# Altium footprint library STM32_Watch.PcbLib: 180 footprints (part 12 of 12)
Each footprint in its own frame and in the unit in brackets; x right, y up, seen from the top. Pads: shape width x height; smd on the part's side, far side on the other; paste and mask are expansions set on the pad; w line width, h text height; cw(c..) or ccw(c..) is an arc to the next point about the centre after c.
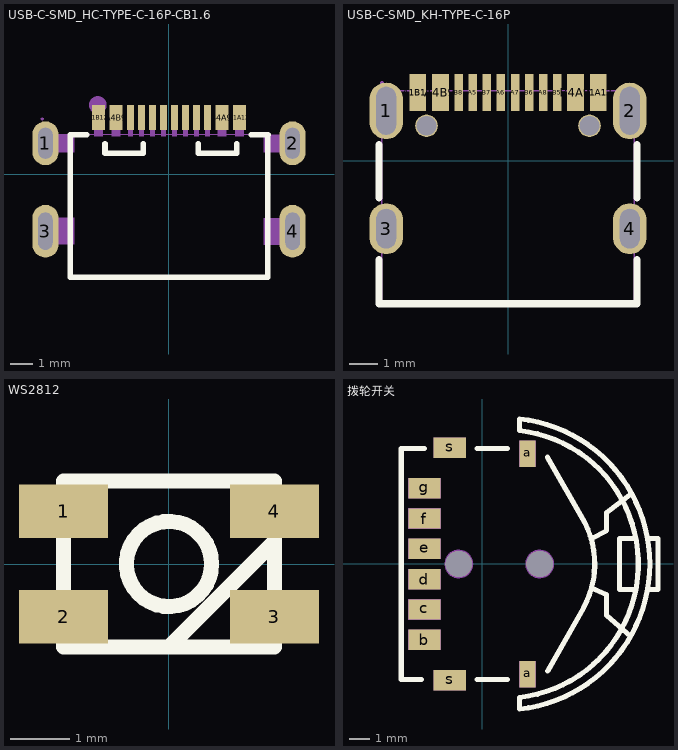
[diagram p11: the footprints below, top view; thin cyan lines are the x and y axes]

## USB-C-SMD_HC-TYPE-C-16P-CB1.6 [mm]
pads (16):
  oval 1.2x2 hole 0.65 slot 1.4 at 90 deg mask+0.051: 1(-5.62,1.414) 2(5.62,1.414)
  oval 1.2x2.4 hole 0.65 slot 1.7 at 90 deg copper offset 0.005,0 mask+0.051: 3(-5.625,-2.586)
  oval 1.2x2.4 hole 0.65 slot 1.7 at 90 deg copper offset -0.005,0 mask+0.051: 4(5.625,-2.586)
  rect 0.6x1.15 smd mask+0.051: A1B12(-3.21,2.586) A4B9(-2.41,2.586) B1A12(3.21,2.585) B4A9(2.41,2.585)
  rect 0.3x1.15 smd mask+0.051: A5(-1.25,2.585) A6(-0.25,2.585) A7(0.25,2.584) A8(-1.75,2.585) B5(1.75,2.585) B6(0.75,2.585) B7(-0.75,2.584) B8(1.25,2.585)
Top Overlay:
  lines w0.254: -3.741,1.809 -4.5,1.809 -4.5,-4.691 4.45,-4.691 4.5,-4.691 4.5,1.809 ; -2.912,1.397 -2.912,0.954 -1.162,0.954 -1.162,1.398 ; 1.334,1.398 1.334,0.957 3.084,0.957 3.084,1.398 ; 3.741,1.809 3.796,1.809 4.505,1.809
Top Paste:
  drawing of 16 lines, arcs and shapes, not listed
Mechanical 6:
  circle w0.4: c-3.238,3.158 r0.2
Mechanical 15:
  region: 4.303,-3.195 4.303,-1.995 5.473,-1.995 5.773,-1.995 5.773,-3.195
  region: 4.303,1.005 4.303,1.805 5.773,1.81 5.773,0.992 4.303,1.005
  region: 1.65,2.524 1.85,2.524 1.85,1.724 1.65,1.724
  region: 1.15,2.524 1.35,2.524 1.35,1.724 1.15,1.724
  region: 0.65,2.524 0.85,2.524 0.85,1.724 0.65,1.724
  region: 0.15,2.524 0.35,2.524 0.35,1.724 0.15,1.724
  region: -0.35,2.524 -0.15,2.524 -0.15,1.724 -0.35,1.724
  region: -0.85,2.524 -0.65,2.524 -0.65,1.724 -0.85,1.724
  region: -1.35,2.524 -1.15,2.524 -1.15,1.724 -1.35,1.724
  region: -1.85,2.524 -1.65,2.524 -1.65,1.724 -1.85,1.724
  region: 3.01,2.524 3.41,2.524 3.41,1.724 3.01,1.724
  region: 2.21,2.524 2.61,2.524 2.61,1.724 2.21,1.724
  region: -3.01,1.724 -3.41,1.724 -3.41,2.524 -3.01,2.524
  region: -2.21,1.724 -2.61,1.724 -2.61,2.524 -2.21,2.524
  region: 5.47,1.814 5.77,1.814 5.77,1.014 5.47,1.014
  region: -5.77,1.814 -5.47,1.814 -5.47,1.014 -5.77,1.014
  region: 5.47,-1.986 5.77,-1.986 5.77,-3.186 5.47,-3.186
  region: -5.77,-1.986 -5.47,-1.986 -5.47,-3.186 -5.77,-3.186
  region: -5.77,-3.186 -5.77,-1.986 -4.6,-1.986 -4.3,-1.986 -4.3,-3.186
  region: -5.77,1.014 -5.77,1.814 -4.3,1.819 -4.3,1.002 -5.77,1.014
  region: -5.71,2.524 -5.71,2.549 -5.745,2.584 -5.795,2.584 -5.83,2.549 -5.83,2.524 -5.83,2.5 -5.795,2.464 -5.745,2.464 -5.71,2.5 -5.71,2.524
  lines w0.051: -4.47,-4.686 4.47,-4.686 4.47,1.814 -4.47,1.814 -4.47,-4.686
3D body "3D_PCB1_2023-02-18.step": height 1.56, standoff -1.6, extent -5.77,-4.826 5.77,2.374

## USB-C-SMD_KH-TYPE-C-16P [mm]
pads (18):
  oval 1.2x2 hole 0.7 slot 1.7 at 90 deg mask+0.051: 1(-4.32,1.765) 2(4.32,1.765)
  oval 1.2x1.8 hole 0.7 slot 1.4 at 90 deg mask+0.051: 3(-4.32,-2.415) 4(4.32,-2.415)
  rect 0.6x1.3 smd mask+0.05: A1B12(-3.2,2.415) A4B9(-2.4,2.415) B1A12(3.2,2.415) B4A9(2.4,2.415)
  rect 0.3x1.3 smd mask+0.05: A5(-1.25,2.415) A6(-0.25,2.415) A7(0.25,2.415) A8(1.25,2.415) B5(1.75,2.415) B6(0.75,2.415) B7(-0.75,2.415) B8(-1.75,2.415)
  round 0.8 hole 0.7: ""(-2.89,1.235) ""(2.89,1.235)
Top Overlay:
  lines w0.254: -4.572,-3.507 -4.572,-5.08 4.572,-5.08 4.572,-3.507 ; -4.572,-1.323 -4.572,0.573 ; 4.572,-1.323 4.572,0.573
Top Paste:
  drawing of 16 lines, arcs and shapes, not listed
Mechanical 6:
  circle w0.25: c-2.89,1.235 r0.125
  circle w0.25: c2.89,1.235 r0.125
Mechanical 15:
  region: -4.41,2.76 -4.41,2.785 -4.445,2.82 -4.495,2.82 -4.53,2.785 -4.53,2.76 -4.53,2.735 -4.495,2.7 -4.445,2.7 -4.41,2.735 -4.41,2.76
  region: -4.47,2.315 -4.17,2.315 -4.17,1.215 -4.47,1.215
  region: 4.17,2.315 4.47,2.315 4.47,1.215 4.17,1.215
  region: -4.47,-2.015 -4.17,-2.015 -4.17,-2.815 -4.47,-2.815
  region: 4.17,-2.015 4.47,-2.015 4.47,-2.815 4.17,-2.815
  region: 1.15,2.76 1.35,2.76 1.35,1.76 1.15,1.76
  region: 1.65,2.76 1.85,2.76 1.85,1.76 1.65,1.76
  region: 0.65,2.76 0.85,2.76 0.85,1.76 0.65,1.76
  region: 0.15,2.76 0.35,2.76 0.35,1.76 0.15,1.76
  region: -0.35,2.76 -0.15,2.76 -0.15,1.76 -0.35,1.76
  region: -0.85,2.76 -0.65,2.76 -0.65,1.76 -0.85,1.76
  region: -1.35,2.76 -1.15,2.76 -1.15,1.76 -1.35,1.76
  region: -1.85,2.76 -1.65,2.76 -1.65,1.76 -1.85,1.76
  region: 3,2.76 3.2,2.76 3.2,1.76 3,1.76
  region: 3.2,2.76 3.4,2.76 3.4,1.76 3.2,1.76
  region: 2.2,2.76 2.4,2.76 2.4,1.76 2.2,1.76
  region: 2.4,2.76 2.6,2.76 2.6,1.76 2.4,1.76
  region: -2.6,2.76 -2.4,2.76 -2.4,1.76 -2.6,1.76
  region: -2.4,2.76 -2.2,2.76 -2.2,1.76 -2.4,1.76
  region: -3.4,2.76 -3.2,2.76 -3.2,1.76 -3.4,1.76
  region: -3.2,2.76 -3,2.76 -3,1.76 -3.2,1.76
  lines w0.051: -4.47,-5.08 -4.47,2.47 4.47,2.47 4.47,-5.08 -4.47,-5.08
3D body "3D_PCB1_2023-03-25.step": height 3.25, standoff -1.1, extent -4.47,-5.016 4.47,2.794

## WS2812 [mm]
pads (4):
  rect 1.5x0.9 smd: 1(-1.778,0.889) 2(-1.778,-0.889) 3(1.778,-0.889) 4(1.778,0.889)
Top Overlay:
  circle w0.254: c0,0 r0.718
  lines w0.254: 0,-1.397 1.778,0.381 ; -1.778,-1.397 1.778,-1.397 1.778,1.397 -1.778,1.397 -1.778,-1.397
3D body "User Library-LED RGB 3528.STEP": height 1.9, standoff 0, extent -1.725,-1.4 1.775,1.4

## 拨轮开关 [mm]
pads (12):
  rect 0.8x1.3 smd: a(2.25,-5.45) a(2.25,5.45)
  rect 1.6x1 smd: b(-2.85,-3.75) c(-2.85,-2.25) d(-2.85,-0.75) e(-2.85,0.75) f(-2.85,2.25) g(-2.85,3.75) s(-1.6,-5.75) s(-1.6,5.75)
  round 1.3 hole 1.3 unplated: ""(-1.15,0) ""(2.85,0)
Top Overlay:
  lines w0.254: -3.008,-5.715 -4,-5.715 -4,5.715 -2.857,5.715 ; -0.254,-5.715 1.254,-5.715 ; -0.254,5.715 1.254,5.715 ; 3.23,5.293 5.071,2.06 ; 3.238,-5.298 5.017,-2.159 ccw(c1.08,0) 5.07,2.06 ; 5.395,1.244 6.16,1.651 6.16,2.54 7.395,3.492 ; 5.41,-1.19 6.16,-1.524 6.16,-2.54 7.343,-3.584 ; 7.605,-1.273 6.795,-1.27 6.795,1.27 7.606,1.267 ; 8.183,-1.272 8.7,-1.27 8.7,1.27 8.183,1.27 ; 1.849,-7.175 ccw(c1.08,0) 1.849,7.175 1.855,6.604 cw(c1.08,0) 1.849,-6.604 1.849,-7.175
Mechanical 4:
  circle w0.65: c2.85,0 r0.325
  circle w0.65: c-1.15,0 r0.325
Mechanical 5:
  circle w0.127: c2.85,0 r0.65
  circle w0.127: c-1.15,0 r0.65
  region: -0.8,-5.25 -0.8,-6.25 -2.4,-6.25 -2.4,-5.25
  region: -0.8,6.25 -0.8,5.25 -2.4,5.25 -2.4,6.25
  region: 2.65,6.1 2.65,4.8 1.85,4.8 1.85,6.1
  region: 2.65,-4.8 2.65,-6.1 1.85,-6.1 1.85,-4.8
  region: -2.05,-3.25 -2.05,-4.25 -3.65,-4.25 -3.65,-3.25
  region: -2.05,-1.75 -2.05,-2.75 -3.65,-2.75 -3.65,-1.75
  region: -2.05,-0.25 -2.05,-1.25 -3.65,-1.25 -3.65,-0.25
  region: -2.05,1.25 -2.05,0.25 -3.65,0.25 -3.65,1.25
  region: -2.05,2.75 -2.05,1.75 -3.65,1.75 -3.65,2.75
  region: -2.05,4.25 -2.05,3.25 -3.65,3.25 -3.65,4.25
3D body "3D_PCB1_2023-02-10.step": height 3, standoff -0.5, extent -3.281,-7.275 8.719,7.275